# Altium integrated library Integrated_Library - 02.02.25 - 22.49.IntLib: 792 symbols (part 11 of 11)
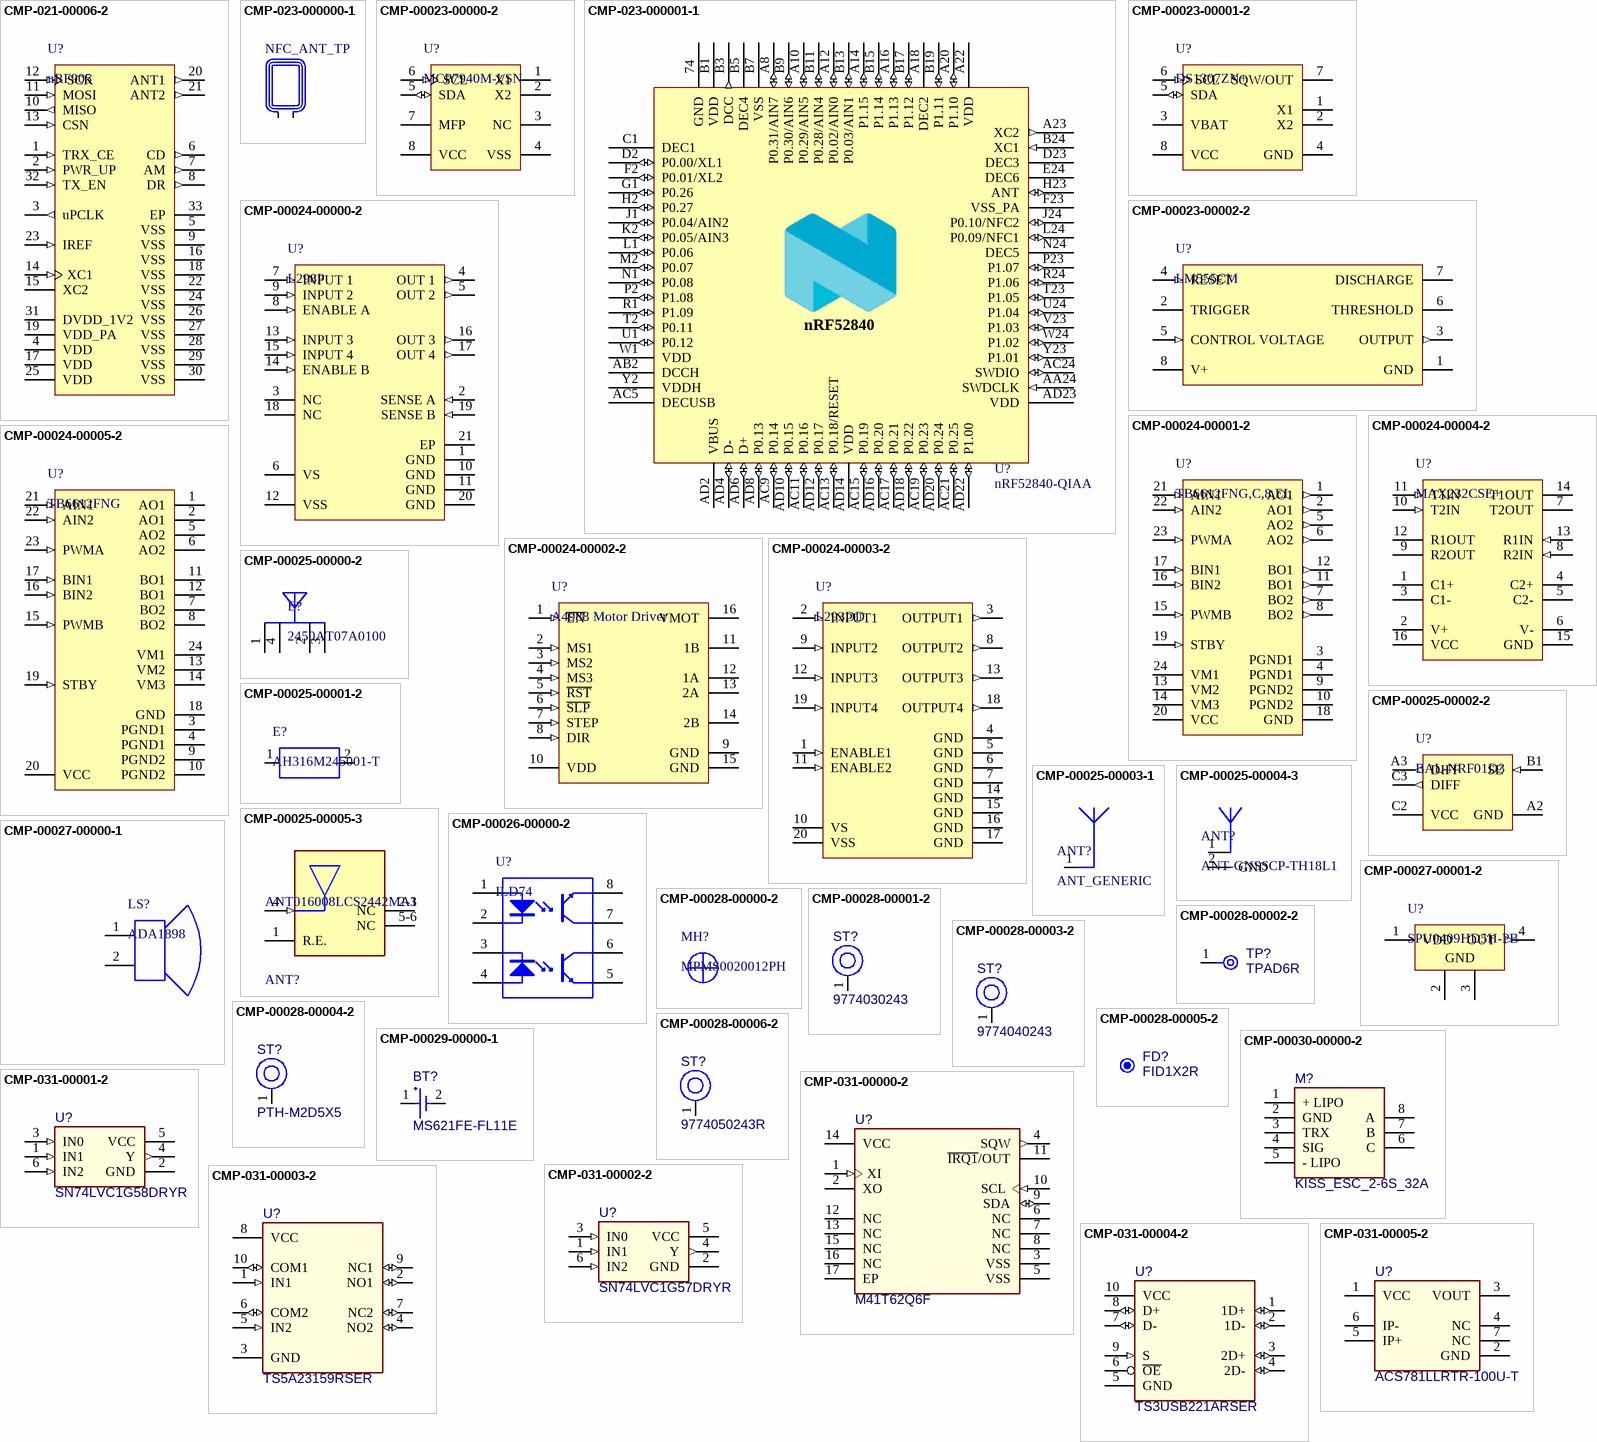
[diagram p36: symbols CMP-021-00006-2 to CMP-031-00005-2]

## CMP-00024-00001-2
designator U?, comment TB6612FNG,C,8,EL
Driver IC for Dual DC Motor, 2.7 to 5.5 V, 1 A, -20 to 85 degC, 24-Pin SSOP, RoHS, Tape and Reel; Manufacturer: Toshiba; Interface: Parallel; Pins: 24; Manufacturer URL: http://www.toshiba.com/; Packaging: TapeandReel; Package Reference: SSOP-24; Max Operating Temperature: 85°C; RoHS Compliant: True; Min Operating Temperature: -20°C; Package Description: 24-Pin Shrink Small Outline Package Integrated Circuit, Body 7.8 x 5.6 mm, Pitch 0.65 mm; Datasheet URL: https://toshiba.semicon-storage.com/info/docget.jsp?did=10660&prodName=TB6612FNG; Package Quantity: 1; Datasheet Version: Oct-14; Case/Package: SSOP-24; Mounting Technology: SM
footprint TOSH-SSOP-24_M (SOP, 24-Leads, Body 8x5.8mm, Pitch 0.65mm, IPC Low Density)
footprint TOSH-SSOP-24_L (SOP, 24-Leads, Body 8x5.8mm, Pitch 0.65mm, IPC High Density)
footprint TOSH-SSOP-24_N (SOP, 24-Leads, Body 8x5.8mm, Pitch 0.65mm, IPC Medium Density)
pins: 1 AO1 (out) "ch A output 1", 2 AO1 (out) "ch A output 1", 3 PGND1 (power) "Power GND 1", 4 PGND1 (power) "Power GND 1", 5 AO2 (out) "ch A output 2", 6 AO2 (out) "ch A output 2", 7 BO2 (out) "ch B output 2", 8 BO2 (out) "ch B output 2", 9 PGND2 (power) "Power GND 2", 10 PGND2 (power) "Power GND 2", 11 BO1 (out) "ch B output 1", 12 BO1 (out) "ch B output 1", 13 VM2 (power) "Motor supply", 14 VM3 (power) "Motor supply", 15 PWMB (in) "ch B PWM input /200 KOhm pull-down at internal", 16 BIN2 (in) "ch B input 2/200 KOhm pull-down at internal", 17 BIN1 (in) "ch B input 1/200 KOhm pull-down at internal", 18 GND (power) "Small signal GND", 19 STBY (in) ""L" = standby/200 kOhm pull-down at internal", 20 VCC (power) "Small signal supply", 21 AIN1 (in) "ch A input 1/200 KOhm pull-down at internal", 22 AIN2 (in) "ch A input 2/200 KOhm pull-down at internal", 23 PWMA (in) "ch A PWM input /200 KOhm pull-down at internal", 24 VM1 (power) "Motor supply"

## CMP-00024-00002-2
designator U?, comment A4988 Motor Driver
Stepper Motor Driver Carrier, 3 to 5.5 V, 2 A, 16-Pin THD; Manufacturer: Pololu Robotics & Electronics; Datasheet Version: Dec-15; Package Description: 16-Pin Through Hole Device, Body 20.3 x 15.2 mm, Pitch 2.54 mm; Case/Package: A4988MotorDriver; Mounting Technology: TH; RoHS Compliant: Unknown; Datasheet URL: https://www.pololu.com/file/0J1082/a4988-stepper-motor-driver-carrier-dimension-diagram.pdf; Package Reference: A4988 Motor Driver
footprint Polo-A4988 Motor Driver_V (THD, 16-Leads, Body 20.3x15.2mm, Pitch 2.54mm)
pins: 1 ~{EN} (in), 2 MS1 (in), 3 MS2 (in), 4 MS3 (in), 5 ~{RST} (in), 6 ~{SLP} (in), 7 STEP (in), 8 DIR (in), 9 GND (power), 10 VDD (power), 11 1B (power), 12 1A (power), 13 2A (power), 14 2B (power), 15 GND (power), 16 VMOT (power)

## CMP-00024-00003-2
designator U?, comment L293DD
Push-Pull Four Channel Driver with Diodes, 4.5 to 36 V, 20-Pin SOIC, RoHS, Tube; Manufacturer: STMicroelectronics; Outputs: 4; Nominal Supply Voltage: 24V; Nominal Supply Current: 2mA; Output Current: 600mA; Max Supply Voltage: 36V; Min Supply Voltage: 4.5V; Package Reference: SOIC-20; Mounting Technology: SM; Datasheet Version: Jul-03; Manufacturer URL: http://www.st.com/; Pins: 20; Package Quantity: 40; Min Operating Temperature: -40°C; RoHS Compliant: True; Package Description: 20-Pin Small Outline Integrated Circuit, Body 12.8 x 7.5 mm, Pitch 1.27 mm; Case/Package: SOIC; Datasheet URL: http://www.st.com/content/ccc/resource/technical/document/datasheet/04/ac/22/f9/20/5d/43/a1/CD00000059.pdf/files/CD00000059.pdf/jcr:content/translations/en.CD00000059.pdf; Packaging: Rail/Tube; Max Operating Temperature: 150°C
footprint STM-SOIC-20_M (SOIC, 20-Leads, Body 13x7.6mm, Pitch 1.27mm, IPC Low Density)
footprint STM-SOIC-20_N (SOIC, 20-Leads, Body 13x7.6mm, Pitch 1.27mm, IPC Medium Density)
footprint STM-SOIC-20_L (SOIC, 20-Leads, Body 13x7.6mm, Pitch 1.27mm, IPC High Density)
pins: 1 ENABLE1 (in), 2 INPUT1 (in), 3 OUTPUT1 (out), 4 GND (power), 5 GND (power), 6 GND (power), 7 GND (power), 8 OUTPUT2 (out), 9 INPUT2 (in), 10 VS (power), 11 ENABLE2 (in), 12 INPUT3 (in), 13 OUTPUT3 (out), 14 GND (power), 15 GND (power), 16 GND (power), 17 GND (power), 18 OUTPUT4 (out), 19 INPUT4 (in), 20 VSS (power)

## CMP-00024-00004-2
designator U?, comment MAX232CSE+
Multichannel RS-232 Driver/Receiver, 5 V, 0 to 70 degC, 16-Pin SOIC (S16+3), RoHS, Tube; Manufacturer: Maxim; Package Version: Rev. G, 01/2016; Min Supply Voltage: 4.5V; Max Supply Voltage: 5.5V; Receivers: 2; Propagation Delay: 10us; Nominal Supply Current: 10mA; Data Rate: 120Kbps; Nominal Supply Voltage: 5V; Package URL: http://pdfserv.maximintegrated.com/package_dwgs/21-0041.PDF; Min Operating Temperature: 0°C; Datasheet URL: https://datasheets.maximintegrated.com/en/ds/MAX220-MAX249.pdf; Package Quantity: 50; Case/Package: SOIC; Package Description: 16-Pin Small Outline Integrated Circuit, Body 9.9 x 3.9 mm, Pitch 1.27 mm; Package Reference: S16+5; Interface: RS-232; Pins: 16; Manufacturer URL: http://www.maximintegrated.com/; Channels: 2; RoHS Compliant: True; Mounting Technology: SM; Packaging: Rail/Tube; Max Operating Temperature: 70°C; Datasheet Version: Rev. 17, 01/2015
footprint MAXM-S16+5_L (SOIC, 16-Leads, Body 10x4mm, Pitch 1.27mm, IPC High Density)
footprint MAXM-S16+5_M (SOIC, 16-Leads, Body 10x4mm, Pitch 1.27mm, IPC Low Density)
footprint MAXM-S16+5_N (SOIC, 16-Leads, Body 10x4mm, Pitch 1.27mm, IPC Medium Density)
pins: 1 C1+, 2 V+ (power), 3 C1-, 4 C2+, 5 C2-, 6 V- (power), 7 T2OUT (hiz), 8 R2IN (in), 9 R2OUT (hiz), 10 T2IN (in), 11 T1IN (in), 12 R1OUT (hiz), 13 R1IN (in), 14 T1OUT (hiz), 15 GND (power), 16 VCC (power)

## CMP-00024-00005-2
designator U?, comment TB6612FNG
Driver IC for Dual DC Motor, 15 V, -20 to 85 degC, 24-Pin SSOP, RoHS, Tape and Reel; Manufacturer: Toshiba; Case/Package: SSOP-24; RoHS Compliant: False; Package Description: 24-Pin Shrink Small Outline Package Integrated Circuit, Body 7.8 x 5.6 mm, Pitch 0.65 mm; Package Reference: SSOP-24; Datasheet Version: Oct-14; Mounting Technology: SM; Manufacturer URL: http://www.toshiba.com/; Datasheet URL: https://toshiba.semicon-storage.com/info/docget.jsp?did=10660&prodName=TB6612FNG
footprint TOSH-SSOP-24_M (SOP, 24-Leads, Body 8x5.8mm, Pitch 0.65mm, IPC Low Density)
footprint TOSH-SSOP-24_L (SOP, 24-Leads, Body 8x5.8mm, Pitch 0.65mm, IPC High Density)
footprint TOSH-SSOP-24_N (SOP, 24-Leads, Body 8x5.8mm, Pitch 0.65mm, IPC Medium Density)
pins: 1 AO1 (hiz) "chA output1", 2 AO1 (hiz) "chA output1", 3 PGND1 (power) "Power GND 1", 4 PGND1 (power) "Power GND 1", 5 AO2 (hiz) "chA output2", 6 AO2 (hiz) "chA output2", 7 BO2 (hiz) "chB output2", 8 BO2 (hiz) "chB output2", 9 PGND2 (power) "Power GND 2", 10 PGND2 (power) "Power GND 2", 11 BO1 (hiz) "chB output1", 12 BO1 (hiz) "chB output1", 13 VM2 (power) "Motor supply(2.5V~13.5V)", 14 VM3 (power) "Motor supply(2.5V~13.5V)", 15 PWMB (in) "chB PWM input / 200kohm pull-down at internal", 16 BIN2 (in) "chB input2 / 200kohm pull-down at internal", 17 BIN1 (in) "chB input1 / 200kohm pull-down at internal", 18 GND (power) "Small signal GND", 19 STBY (in) "“L”=standby / 200kohm pull-down at internal", 20 VCC (power) "Small signal supply (2.7V~5.5V)", 21 AIN1 (in) "chA input2 / 200kohm pull-down at internal", 22 AIN2 (in) "chA input1 / 200kohm pull-down at internal", 23 PWMA (in) "chA PWM input / 200kohm pull-down at internal", 24 VM1 (power) "Motor supply(2.5V~13.5V)"

## CMP-00025-00000-2
designator E?, comment 2450AT07A0100
Ultra-Miniature Chip Antenna, 2.4 GHz, 2 W Max, -40 to 125 degC, 4-Pin SMD, RoHS, Tape and Reel; Manufacturer: Johanson Technology; Datasheet Version: Rev. 3.0 , 02/2016; Datasheet URL: http://www.johansontechnology.com/datasheets/antennas/2450AT07A0100.pdf; Case/Package: 2450AT07A0100; Package Reference: 2450AT07A0100; Package Description: 4-Pin Dual Flat No-lead, Body 1 x 0.5 mm, Pitch 0.6 mm; Mounting Technology: SM; RoHS Compliant: Unknown
footprint JT-2450AT07A0100-4_V (DFN, 4-Leads, Body 1x0.5mm, Pitch 0.60mm)
pins: 1 Feed, 2 GND (power), 3 GND (power), 4 Feed

## CMP-00025-00001-2
designator E?, comment AH316M245001-T
Chip Antenna, 2.4 to 2.5 GHz, -40 to 85 degC, 2-Pin SMD, Pb-Free, Tape and Reel; Manufacturer: Taiyo Yuden; Frequency: 2.45GHz; Impedance: 50Ohm; Manufacturer URL: http://www.t-yuden.com/; Datasheet Version: Sep-15; Min Operating Temperature: -20°C; Mounting Technology: SM; RoHS Compliant: True; Case/Package: AH316M-2; Datasheet URL: http://www.yuden.co.jp/productdata/catalog/en/chipantenna01_e.pdf; Max Operating Temperature: 80°C; Package Quantity: 3000; Pins: 2; Packaging: TapeandReel; Package Description: 2-Pin Surface Mount Device, Body 3.2 x 1.6 mm; Package Reference: AH316M-2
footprint TAYO-AH316M-2_L (Chip, 2-Leads, Body 3.35x1.75mm, IPC High Density)
footprint TAYO-AH316M-2_M (Chip, 2-Leads, Body 3.35x1.75mm, IPC Low Density)
footprint TAYO-AH316M-2_N (Chip, 2-Leads, Body 3.35x1.75mm, IPC Medium Density)
pins: 1, 2

## CMP-00025-00002-2
designator U?, comment BAL-NRF01D3
Conjugate Match Balun to nRF51422-QFAA, nRF24LE1, nRF51822-QFAA/AB, with Integrated Harmonic Filte, 50 Ohm, 2400 to 2540 MHz, -40 to 105 degC, 5-Ball BGA, RoHS, Tape and Reel; Manufacturer: STMicroelectronics; Shielding: Unshielded; Impedance: 50Ohm; Package Reference: Flip-Chip_5B; Min Operating Temperature: -40°C; Datasheet URL: http://www.st.com/st-web-ui/static/active/en/resource/technical/document/datasheet/DM00055606.pdf; Packaging: CutTape; Package Quantity: 1; RoHS Compliant: True; Pins: 5; Max Operating Temperature: 85°C; Manufacturer URL: http://www.st.com/; Datasheet Version: Rev. 6, 07/2015; Case/Package: Flip-Chip_5B; Package Description: 5-Ball Flip Chip, Body 1.5 x 1 mm, Pitch 0.6 mm; Resistance: 50Ohm; Mounting Technology: SM
footprint STM-Flip-Chip_5B_V (BGA, 5-Balls, Body 1.5x1mm)
pins: A2 GND (power), A3 DIFF (out), B1 SE (in), C2 VCC (power), C3 DIFF (out)

## CMP-00025-00003-1
designator ANT?, comment ANT_GENERIC
Generic Monopole Antenna
pins: 1 FEED

## CMP-00025-00004-3
designator ANT?, comment ANT-GNSSCP-TH18L1
Rf Ant Gnss Patch L1 18X18 Pin
footprint ANT-GNSSCP-TH18L1-Footprint-1
pins: 1 RF_IN, 2 GND

## CMP-00025-00005-3
designator ANT?, comment ANT016008LCS2442MA1
RF/Microwave Antenna, 2400MHz Min, 2484MHz Max; Characteristic Impedance: 50R; RoHS Compliant: Yes; Min Operating Temperature: -40°C; Construction: COMPONENT; Max Operating Temperature: 85°C
footprint FP-ANT016-MFG
pins: 1 R.E., 2-3 NC, 4 Feed point (in), 5-6 NC

## CMP-00026-00000-2
designator U?, comment ILD74
Optocoupler, Phototransistor Output, Dual Channel, 1.3 V, -55 to 100 degC, 8-Pin DIP, RoHS, Tube; Manufacturer: Vishay; Output Voltage: 70V; Power: 400mW; Vce Max: 500mV; Forward Voltage: 1.5V; Package Version: Rev. 1.1, 12/2003; Nominal Vf: 1.3V; Channels: 2; Forward Current: 60mA; Packaging: Rail/Tube; Datasheet Version: Rev. 1.7, 05/2011; Package Reference: DIP8; Package Description: 8-Pin Double In-line Package, Body 9.77 x 6.645 mm, Pitch 2.54 mm; Pins: 16; Mounting Technology: TH; Max Operating Temperature: 100°C; Package URL: http://www.vishay.com/docs/83241/83241.pdf; Datasheet URL: http://www.vishay.com/docs/83640/ild74.pdf; Case/Package: PDIP; Package Quantity: 2000; Manufacturer URL: http://www.vishay.com/; RoHS Compliant: True; Min Operating Temperature: -55°C
footprint VISH-DIP8 (DIP, 8-Leads, Body 9.9x6.8mm, Pitch 2.54mm)
pins: 1 A, 2 C, 3 C, 4 A, 5 E, 6 C, 7 C, 8 E

## CMP-00027-00000-1
designator LS?, comment ADA1898
Mini Speaker, 8 Ohm, 0.2 Wmax, -10 to 40 degC, 2-Pin THD, RoHS; Manufacturer: Adafruit Industries; Mounting Technology: TH; Datasheet URL: https://cdn-shop.adafruit.com/datasheets/P1898.pdf; Package Description: 2-Pin Through Hole Device, Dia 29.3 mm, Pitch 15 mm; Case/Package: ADA1898; Package Reference: ADA1898; Datasheet Version: Mar-14; Manufacturer URL: https://www.adafruit.com/; RoHS Compliant: Unknown
footprint ADAI-ADA1898 (THD, 2-Leads, Dia 29.3mm, Pitch 15mm)
pins: 1 +, 2 -

## CMP-00027-00001-2
designator U?, comment SPU0409HD5H-PB
SiSonic(TM) Microphone, 1.5 to 3.6 V, -40 to 100 degC, 4-Pin SMD, RoHS, Tape and Reel; Manufacturer: Knowles Acoustics; Voltage Rating: 3.6V; Impedance: 100Ohm; Package Reference: SPU0409HD5H-PB; Mounting Technology: SM; Case/Package: SPU0409HD5H-PB; Package Description: 4-Pin Surface Mount Device, Body 3.76 x 2.95 mm; Datasheet URL: http://datasheet.octopart.com/SPU0409HD5H-PB-Knowles-Acoustics-datasheet-17019172.pdf; Packaging: TapeandReel; Package Quantity: 1200; RoHS Compliant: True; Datasheet Version: Rev. F, 03/2013; Manufacturer URL: http://www.knowles.com/
footprint KNOW-SPU0409HD5H-PB_V (SMD, 4-Leads, Body 3.76x2.95mm)
pins: 1 VDD (power), 2 GROUND (power), 3 GROUND (power), 4 OUT (out)
text: GND

## CMP-00028-00000-2
designator MH?, comment MPMS0020012PH
Copper Pillar, M2 Screw; Manufacturer: B&F Fastener Supply; Drive Type: Phillips; Screw Head Type: PanHead; Mounting Technology: TH; Datasheet URL: https://datasheet.ciiva.com/1034/metd7985a-1034196.pdf; Thread Size: M2; Case/Package: MPMS0020012PH; Package Reference: MPMS0020012PH; Datasheet Version: 42095; Pins: 1; Package Description: 1-Pin Surface Mount Device, Diameter 3.7 mm; Type: MachineScrew; Manufacturer URL: http://www.bffastenersupply.com/; RoHS Compliant: False
footprint BF-MPMS0020012PH (Copper Pillar 9mm, M2 Screw)
pins: 1

## CMP-00028-00001-2
designator ST?, comment 9774030243
WA-SMSI SMT Steel Spacer, M2 Thread Internal, Tin, RoHS, Tape and Reel; Pins: 1
footprint WE-9774030243_V (Round Standoff M2 Steel Spacer)
footprint WE-9774030243_V (Round Standoff M2 Steel Spacer)
pins: 1 H1

## CMP-00028-00002-2
designator TP?, comment TPAD6R  (no BOM)
0.6mm round; Pins: 1
footprint TP06R (Testpoint, round, d=0.6mm)
footprint TP06R (Testpoint, round, d=0.6mm)
pins: 1 TP

## CMP-00028-00003-2
designator ST?, comment 9774040243
WA-SMSI SMT Steel Spacer, M2 Thread Internal, Tin, RoHS, Tape and Reel; Pins: 1
footprint WE-9774030243_V (Round Standoff M2 Steel Spacer)
footprint WE-9774040243_V (Round Standoff M2 Steel Spacer)
pins: 1 H1

## CMP-00028-00004-2
designator ST?, comment PTH-M2D5X5
M2 PTH (2.5mm), 5mm pad; Pins: 1
footprint WE-9774030243_V (Round Standoff M2 Steel Spacer)
footprint PTH-M2D5X5
pins: 1 H1

## CMP-00028-00005-2
designator FD?, comment FID1X2R  (no BOM)
Fiducial - Round 1x2mm; Pins: 0
footprint FID1X2R (Fiducial - Round 1x2mm)
footprint FID1X2R (Fiducial - Round 1x2mm)

## CMP-00028-00006-2
designator ST?, comment 9774050243R
WA-SMSI SMT Steel Spacer, M2 Thread Internal, Tin, RoHS, Tape and Reel; Pins: 1
footprint WE-9774030243_V (Round Standoff M2 Steel Spacer)
footprint WE-9774050243R_V (Round Standoff M2 Steel Spacer)
pins: 1 H1

## CMP-00029-00000-1
designator BT?, comment MS621FE-FL11E
MS Lihium Rechargeable Battery, 3 V, -20 to 60 degC, Tray; RoHS Compliant: NotApplicable; Mounting Technology: WithLeads; Pins: 2
footprint SEIK-MS621FE-FL11E-2_V (SMD, 2-Leads, Diameter 6.8mm)
footprint SEIK-MS621FE-FL11E-2_V (SMD, 2-Leads, Diameter 6.8mm)
pins: 1 +, 2 -

## CMP-00030-00000-2
designator M?, comment KISS_ESC_2-6S_32A
KISS ESC 2-6S 32A (45A limit) - 32bit brushless Motor Ctrl; Pins: 8
footprint ESC 2-6S 32A-Footprint-1
footprint ESC 2-6S 32A-Footprint-1
pins: 1 + LIPO, 2 GND, 3 TRX, 4 SIG, 5 - LIPO, 6 C, 7 B, 8 A

## CMP-031-00000-2
designator U?, comment M41T62Q6F
Low-Power Serial Real-Time Clock (RTC) with Alarm, 1.3 to 4.4 V, -40 to 85 degC, 16-Pin QFN, RoHS, Tape and Reel; Max Supply Voltage: 4.4V; Min Supply Voltage: 1.3V; Case/Package: QFN; Pins: 17; Max Operating Temperature: 85°C; Mounting Technology: SurfaceMount; Min Operating Temperature: -40°C
footprint STM-QFN-16_V (QFN, 16-Leads, Body 3x3mm, Pitch 0.5mm, Thermal Pad 1.8x1.8mm)
footprint STM-QFN-16_V (QFN, 16-Leads, Body 3x3mm, Pitch 0.5mm, Thermal Pad 1.8x1.8mm)
pins: 1 XI (in) "32 KHz oscillator input", 2 XO "32 KHz oscillator output", 3 VSS (power), 4 SQW (out) "32 KHz programmable square wave output", 5 VSS (power) "Battery supply voltage (tie VBAT to VSS if no battery is connected.)", 6 NC "Ground", 7 NC, 8 NC, 9 SDA (io) "Serial data input/output", 10 SCL (in) "Serial clock input", 11 ~{IRQ1}/OUT (oc) "Interrupt 1/output driver/frequency test output (open drain)", 12 NC, 13 NC, 14 VCC (power) "Supply voltage", 15 NC, 16 NC, 17 EP

## CMP-031-00001-2
designator U?, comment SN74LVC1G58DRYR
CONFIGURABLE MULTIPLE-FUNCTION GATE, DRY0006A, LARGE T&R; Pins: 6
footprint DRY0006A_V (SON, 6-Leads, Body 1.45x1mm, Pitch 0.5mm)
footprint DRY0006A_V (SON, 6-Leads, Body 1.45x1mm, Pitch 0.5mm)
pins: 1 IN1 (in), 2 GND (power), 3 IN0 (in), 4 Y (out), 5 VCC (power), 6 IN2 (in)

## CMP-031-00002-2
designator U?, comment SN74LVC1G57DRYR
CONFIGURABLE MULTIPLE-FUNCTION GATE, DRY0006A, LARGE T&R; Pins: 6
footprint DRY0006A_V (SON, 6-Leads, Body 1.45x1mm, Pitch 0.5mm)
footprint DRY0006A_V (SON, 6-Leads, Body 1.45x1mm, Pitch 0.5mm)
pins: 1 IN1 (in), 2 GND (power), 3 IN0 (in), 4 Y (out), 5 VCC (power), 6 IN2 (in)

## CMP-031-00003-2
designator U?, comment TS5A23159RSER
IC SWITCH DUAL SPDT 10UQFN; Min Supply Voltage: 1.65V; Max Supply Voltage: 5.5V; Max Operating Temperature: 85°C; Pins: 10; Min Operating Temperature: -40°C; Case/Package: QFN
footprint RSE0010A_V (QFN, 10-Leads, Body 1.5x2mm, Pitch 0.5mm, TI Recommended)
footprint RSE0010A_V (QFN, 10-Leads, Body 1.5x2mm, Pitch 0.5mm, TI Recommended)
pins: 1 IN1 (in), 2 NO1 (io), 3 GND (power), 4 NO2 (io), 5 IN2 (in), 6 COM2 (io), 7 NC2 (io), 8 VCC (power), 9 NC1 (io), 10 COM1 (io)

## CMP-031-00004-2
designator U?, comment TS3USB221ARSER
ESD Protected, High-Speed USB 2.0 (480 Mbps) 1:2 Multiplexer / Demultiplexer Switch, 6 ohm RON, 2.5 to 3.3V, -40 to 85 degC, 10-Pin UQFN (RSE), Green (RoHS & no Sb/Br); Min Supply Voltage: 2.3V; Max Supply Voltage: 3.6V; Min Operating Temperature: -40°C; Mounting Technology: Surface Mount; Case/Package: QFN; Max Operating Temperature: 85°C; Pins: 10
footprint RSE0010A_V (QFN, 10-Leads, Body 1.5x2mm, Pitch 0.5mm, TI Recommended)
footprint RSE0010A_V (QFN, 10-Leads, Body 1.5x2mm, Pitch 0.5mm, TI Recommended)
pins: 1 1D+ (io) "Bus B", 2 1D- (io) "Bus B", 3 2D+ (io) "Bus B", 4 2D- (io) "Bus B", 5 GND (power) "Ground", 6 ~{OE} "Bus-switch enable", 7 D- (io) "Bus A", 8 D+ (io) "Bus A", 9 S (in) "Select input", 10 VCC (power) "Power supply"

## CMP-031-00005-2
designator U?, comment ACS781LLRTR-100U-T
High-Precision Linear Hall-Effect-Based Current Sensor IC with 200 u? Current Conductor, 3 to 3.6 V, -40 to 150 degC, 7-Pin PSOF, RoHS, Tape and Reel; Pins: 7
footprint ALEG-PSOF-7_V (SOF, 8-Leads, Body 4.8x6.4mm)
footprint ALEG-PSOF-7_V (SOF, 8-Leads, Body 4.8x6.4mm)
pins: 1 VCC (power) "Device power supply terminal", 2 GND (power) "Signal ground terminal", 3 VOUT (power) "Analog output signal", 4 NC "No connection", 5 IP+ "Terminal for current being sampled", 6 IP- "Terminal for current being sampled", 7 NC "No connection"

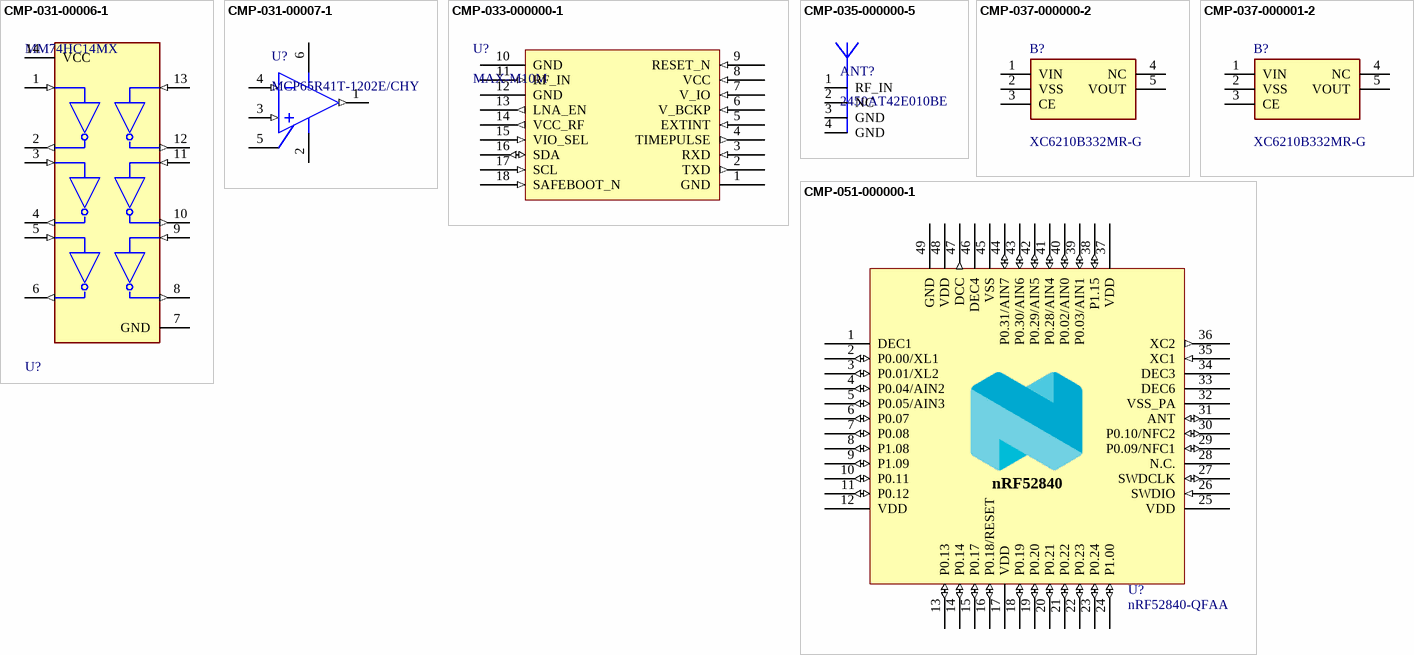
[diagram p26: symbols CMP-031-00006-1 to CMP-051-000000-1]

## CMP-031-00006-1
designator U?, comment MM74HC14MX
Inverter, HC/UH Series, 6-Func, 1-Input, CMOS, PDSO14; Prop. Delay@Nom-Sup: 38ns; Max Supply Voltage: 6V; Power Supplies: 2/6V; Propagation Delay (tpd): 156ns; Package Equivalence Code: SOP14,.25; Load Capacitance (CL): 50pF; Nominal Supply Voltage: 4.5V; Package Body Material: Plastic; Qualification Status: Not Qualified; Max I(ol): 4mA; Number of Inputs: 1; Schmitt Trigger: Yes; Min Supply Voltage: 2V; Channels: 6; Technology: CMOS; JESD-609 Code: e3; Pins: 14; Min Operating Temperature: -40°C; Surface Mount: Yes; Terminal Position: DUAL; Terminal Form: Gull Wing; Width: 3.9mm; Reach SVHC Compliant: Yes; Packaging: Tape and Reel; Terminal Pitch: 1.27mm; Terminal Finish: Tin; Max Operating Temperature: 85°C; Case/Package: SOP; Moisture Sensitivity Level: 1; RoHS Compliant: Yes; Temperature Grade: INDUSTRIAL; Package Shape: Rectangular; Logic Type: INVERTER; Package Style: SMALL OUTLINEMeter; Height - Seated (Max): 1.753mm; JESD-30 Code: R-PDSO-G14; Length: 8.6235mm
footprint FP-751EF-IPC_B
footprint FP-751EF-IPC_A
footprint FP-751EF-IPC_C
footprint FP-751EF-MFG
pins: 1 A1 (in), 2 Y1 (out), 3 A2 (in), 4 Y2 (out), 5 A3 (in), 6 Y3 (out), 7 GND (power), 8 Y4 (out), 9 A4 (in), 10 Y5 (out), 11 A5 (in), 12 Y6 (out), 13 A6 (in), 14 VCC (power)

## CMP-031-00007-1
designator U?, comment MCP65R41T-1202E/CHY
Comparator, 1 Func, 10000uV Offset-Max, 4000ns Response Time, CMOS, PDSO6; Input Offset Voltage-Max: 10mV; Time @ Peak Reflow Temperature-Max (s): 40s; Nominal Supply Voltage: 5V; Package Body Material: Plastic; Output Type: PUSH-PULL; Power Supplies: 2.5V; Qualification Status: Not Qualified; Package Equivalence Code: TSOP6,.11,37; Channels: 1; Supply Voltage Limit-Max: 7V; Average Bias Current-Max (IIB): 5nA; Max Supply Current: 4uA; Technology: CMOS; Package Shape: Rectangular; JESD-609 Code: e4; Terminal Finish: Nickel; Moisture Sensitivity Level: 1; Pins: 6; Length: 2.9mm; Min Operating Temperature: -40°C; Temperature Grade: AUTOMOTIVE; JESD-30 Code: R-PDSO-G6; Terminal Form: Gull Wing; Terminal Position: DUAL; Surface Mount: Yes; Max Operating Temperature: 125°C; Width: 1.55mm; RoHS Compliant: Yes; Amplifier Type: COMPARATOR; Terminal Pitch: 0.95mm; Peak Reflow Temperature (Cel): 260°C; Reach SVHC Compliant: Yes; Package Style: SMALL OUTLINE, LOW PROFILE, SHRINK PITCHMeter; Case/Package: LSSOP; Height - Seated (Max): 1.45mm; Response Time-Nom: 4000ns
footprint SOT-23-CHY6_M (SOT23, 6-Leads, Body 2.9x1.7mm, Pitch 0.95mm, Lead Span 2.8mm, IPC Low Density)
footprint SOT-23-CHY6_L (SOT23, 6-Leads, Body 2.9x1.7mm, Pitch 0.95mm, Lead Span 2.8mm, IPC High Density)
footprint SOT-23-CHY6_N (SOT23, 6-Leads, Body 2.9x1.7mm, Pitch 0.95mm, Lead Span 2.8mm, IPC Medium Density)
pins: 1 OUT (out), 2 VSS (power), 3 VIN+ (in), 4 VIN- (in), 5 VREF (power), 6 VDD (power)

## CMP-033-000000-1
designator U?, comment MAX-M10M
GNSS LCC RX MOD, ROM, CRYSTAL; Design Item ID: MAX-M10M; Source: Symbols.SchLib
footprint MAX-M10M
footprint MAX-M10M
pins: 1 GND (power), 2 TXD (out), 3 RXD (in), 4 TIMEPULSE (out), 5 EXTINT (in), 6 V_BCKP (in), 7 V_IO (in), 8 VCC (in), 9 RESET_N (in), 10 GND (power), 11 RF_IN (in), 12 GND (power), 13 LNA_EN (out), 14 VCC_RF (out), 15 VIO_SEL (in), 16 SDA (io), 17 SCL (in), 18 SAFEBOOT_N (in)

## CMP-035-000000-5
designator ANT?, comment 2450AT42E010BE
2.4GHz Bluetooth, WLAN, Zigbeeâ„¢ Chip RF Antenna 2.4GHz ~ 2.48GHz -2dBi Solder Surface Mount; MF: Johanson Technology; SnapEDA_Link: https://www.snapeda.com/parts/2450AT42E010BE/Johanson%20Technology%20Inc./view-part/2753615/?ref=snap; Design Item ID: 2450AT42E010BE; Value: *; Source: SnapEDAsch.SchLib; Pin Count: 3; Component Type: Standard; MP: 2450AT42E010BE; Package: FBGA-780 Johanson
footprint XDCR_2450AT42E010BE
footprint XDCR_2450AT42E010BE
pins: 1 RF_IN, 2 NC, 3 GND, 4 GND

## CMP-037-000000-2
designator B?, comment XC6210B332MR-G
LDO Voltage Regulators 700mA High Speed Votage Regulator; Manufacturer_Name: Torex; Geometry.Height: 1.3mm; Datasheet Link: https://www.torexsemi.com/file/xc6210/XC6210.pdf; Manufacturer_Part_Number: XC6210B332MR-G; Source: XC6210B332MR-G.SchLib; Mouser Price/Stock: https://www.mouser.co.uk/ProductDetail/Torex-Semiconductor/XC6210B332MR-G?qs=AsjdqWjXhJ%2FS4LOuBYdYHQ%3D%3D; Design Item ID: XC6210B332MR-G; Mouser Part Number: 865-XC6210B332MR-G
footprint SOT95P280X130-5N
footprint SOT95P280X130-5N
pins: 1 VIN, 2 VSS, 3 CE, 4 NC, 5 VOUT

## CMP-037-000001-2
designator B?, comment XC6210B332MR-G
LDO Voltage Regulators 700mA High Speed Votage Regulator; Manufacturer_Name: Torex; Geometry.Height: 1.3mm; Mouser Part Number: 865-XC6210B332MR-G; Datasheet Link: https://www.torexsemi.com/file/xc6210/XC6210.pdf; Mouser Price/Stock: https://www.mouser.co.uk/ProductDetail/Torex-Semiconductor/XC6210B332MR-G?qs=AsjdqWjXhJ%2FS4LOuBYdYHQ%3D%3D; Manufacturer_Part_Number: XC6210B332MR-G; Design Item ID: XC6210B332MR-G; Source: XC6210B332MR-G.SchLib
footprint SOT95P280X130-5N
footprint SOT95P280X130-5N
pins: 1 VIN, 2 VSS, 3 CE, 4 NC, 5 VOUT

## CMP-051-000000-1
designator U?, comment nRF52840-QFAA
Multi-protocol Bluetooth Low Energy, IEEE 802.15.4, ANT and 2.4GHz proprietary system-on-chip; Pad Count: 48; Design Item ID: nRF52840-QFAA; Published: 2016-03-31; Part Number: nRF52840-QFAA; Footprint Doc: QFN-48; Value: nRF52840-QFAA; Component Class: nRF_Devices; LatestRevisionDate: 2016-11-22; Source: nrf52840_qfaa.SCHLIB
footprint QFN40P600X600X90-48N
footprint QFN40P600X600X90-48N
pins: 1 DEC1 (power), 2 P0.00/XL1 (io), 3 P0.01/XL2 (io), 4 P0.04/AIN2 (io), 5 P0.05/AIN3 (io), 6 P0.07 (io), 7 P0.08 (io), 8 P1.08 (io), 9 P1.09 (io), 10 P0.11 (io), 11 P0.12 (io), 12 VDD (power), 13 P0.13 (io), 14 P0.14 (io), 15 P0.17 (io), 16 P0.18/RESET (io), 17 VDD (power), 18 P0.19 (io), 19 P0.20 (io), 20 P0.21 (io), 21 P0.22 (io), 22 P0.23 (io), 23 P0.24 (io), 24 P1.00 (io), 25 VDD (power), 26 SWDIO (in), 27 SWDCLK (io), 28 N.C., 29 P0.09/NFC1 (io), 30 P0.10/NFC2 (io), 31 ANT (io), 32 VSS_PA (power), 33 DEC6 (power), 34 DEC3 (power), 35 XC1 (in), 36 XC2 (out), 37 VDD (power), 38 P1.15 (io), 39 P0.03/AIN1 (io), 40 P0.02/AIN0 (io), 41 P0.28/AIN4 (io), 42 P0.29/AIN5 (io), 43 P0.30/AIN6 (io), 44 P0.31/AIN7 (io), 45 VSS (power), 46 DEC4 (power), 47 DCC (out), 48 VDD (power), 49 GND (power) hidden to GND, 49 GND (power)
text: nRF52840